# Altium schematic symbol library IC_Maxim.SchLib: 843 symbols (part 5 of 20) (continued)
## MAX5064BATC+
designator U?
125V/2A, High-Speed, Half-Bridge MOSFET Driver, inverting & non-inverting high driver, inverting & non-inverting low driver, 12-Pin TQFN, -40癈 to +125癈, Pb-Free; DatasheetVersion: Rev 5, May-2007; PackageVersion: revJ, 2011; PackageReference: T1244+4; PackageDescription: 12-Pin Thin Quad Flatpack, No Leads, 4 x 4 x 0.75 mm Body, 0.8 mm Pitch, TQFN, Pb-Free; Code_JEDEC: MO-220WGGB; ComponentLink1Description: Manufacturer URL; ComponentLink1URL: http://www.maxim-ic.com; ComponentLink2Description: Datasheet; ComponentLink2URL: http://datasheets.maxim-ic.com/en/ds/MAX5062-MAX5064B.pdf; ComponentLink3Description: Package Specification; ComponentLink3URL: http://pdfserv.maxim-ic.com/package_dwgs/21-0139.PDF
footprint QFN12_0.8-PAD(4X4) (Footprint not found)
pins: 1 BST, 2 DH (out), 3 HS, 4 AGND (power), 5 BBM, 6 IN_H- (in), 7 IN_H+ (in), 8 IN_L- (in), 9 IN_L+ (in), 10 PGND (power), 11 DL (out), 12 VDD (power), 13 EP (power)

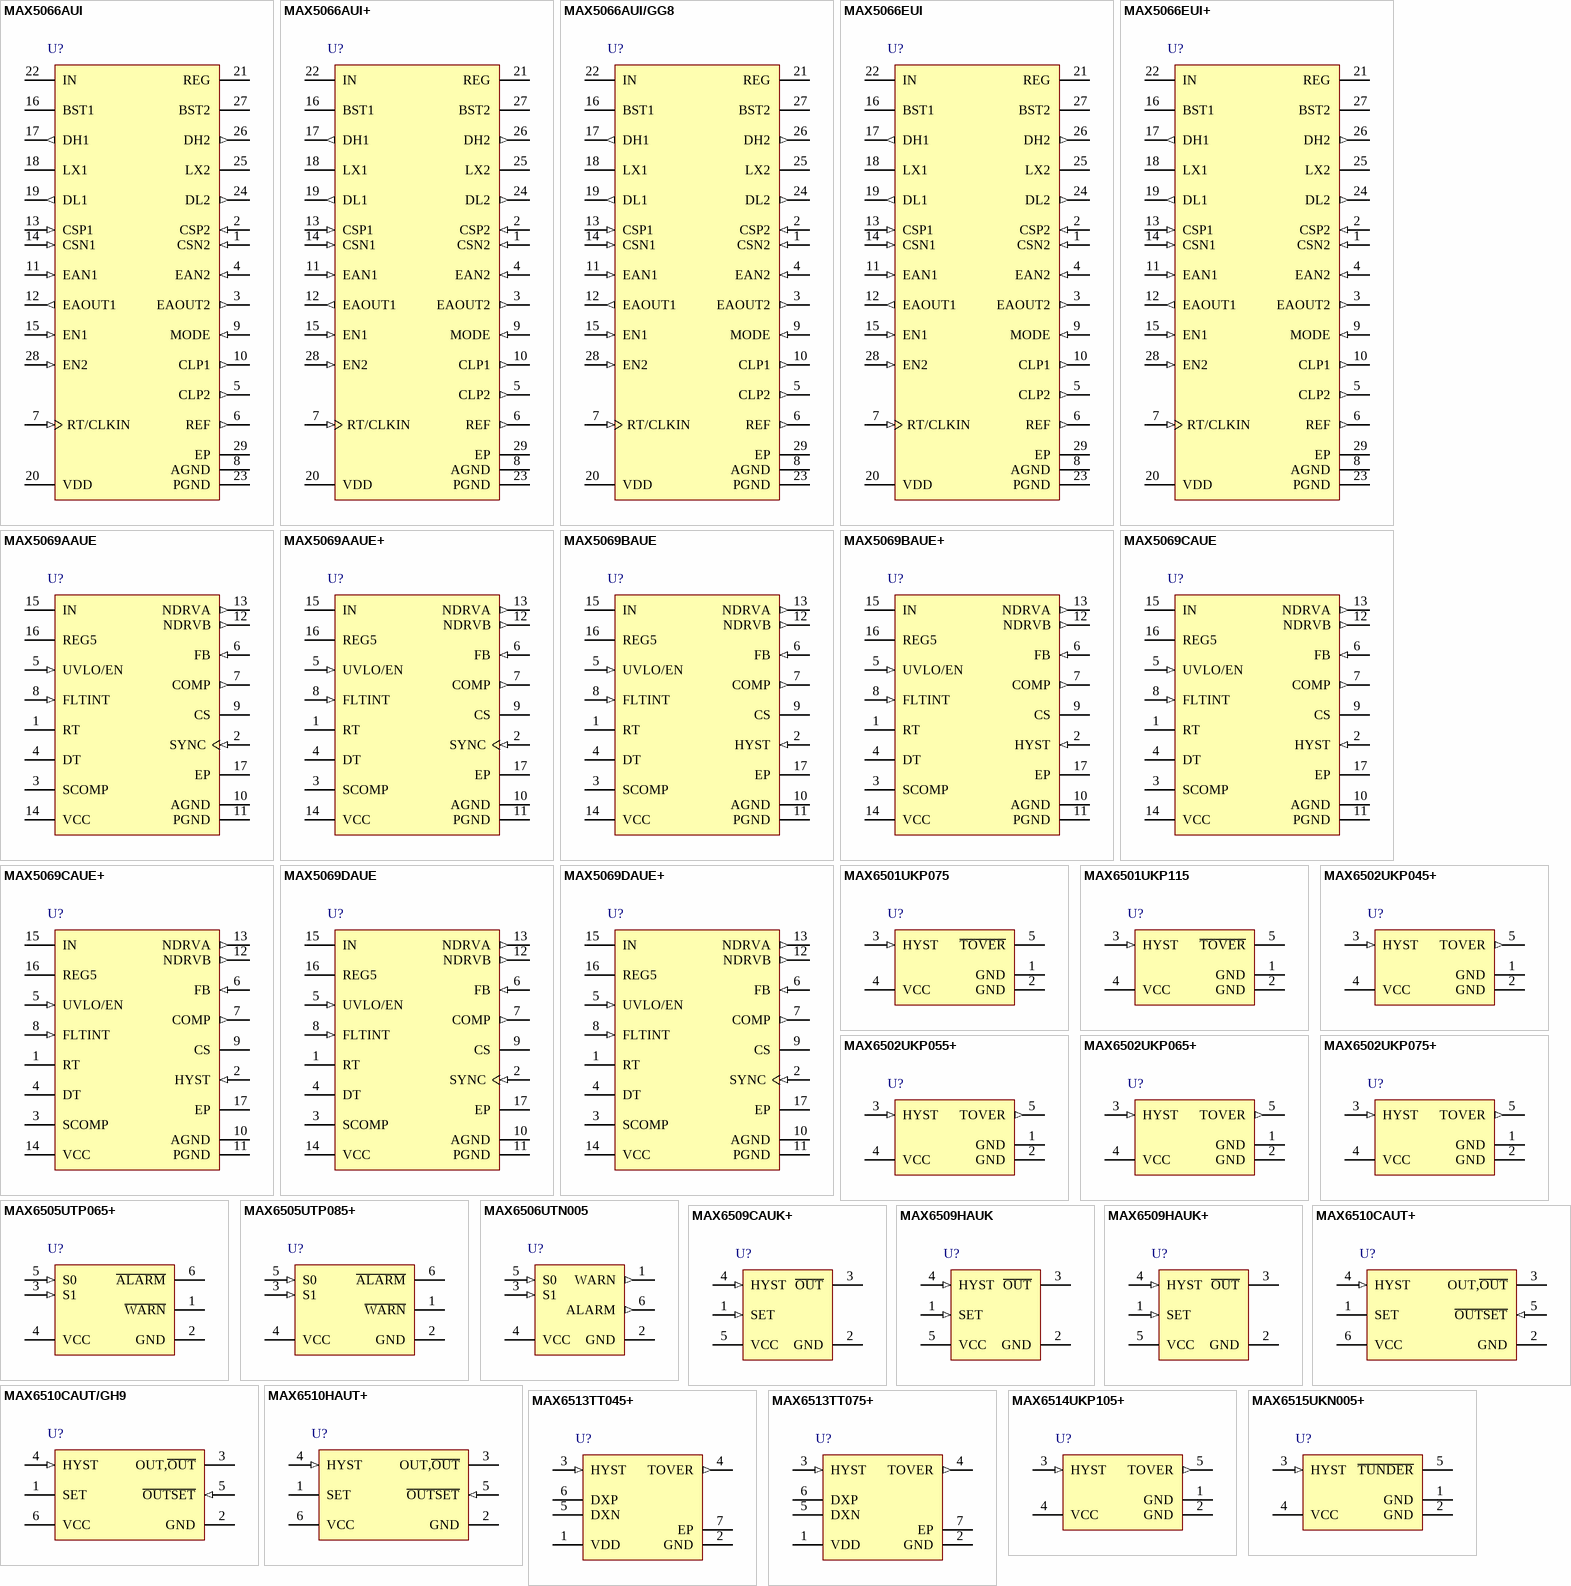
[diagram p8: symbols MAX5066AUI to MAX6515UKN005+]

## MAX5066AUI
designator U?
Configurable, Single-/Dual-Output, Synchronous Buck Controller for High-Current Applications, 28-Pin TSSOP-EP, -40癈 to +125癈; DatasheetVersion: Rev 1, Aug-2005; PackageVersion: revK, 2010; PackageReference: U28E-4; PackageDescription: 28-Pin Thin Shrink Small-Outline Package, Exposed Pad, TSSOP-EP; Code_JEDEC: MO-153-AET; ComponentLink1Description: Manufacturer URL; ComponentLink1URL: http://www.maxim-ic.com; ComponentLink2Description: Datasheet; ComponentLink2URL: http://datasheets.maxim-ic.com/en/ds/MAX5066.pdf; ComponentLink3Description: Package Specification; ComponentLink3URL: http://pdfserv.maxim-ic.com/package_dwgs/21-0108.PDF
footprint TSSOP28_0.65-PAD (Footprint not found)
pins: 1 CSN2 (in), 2 CSP2 (in), 3 EAOUT2 (out), 4 EAN2 (in), 5 CLP2 (out), 6 REF (out), 7 RT/CLKIN (in), 8 AGND (power), 9 MODE (in), 10 CLP1 (out), 11 EAN1 (in), 12 EAOUT1 (out), 13 CSP1 (in), 14 CSN1 (in), 15 EN1 (in), 16 BST1, 17 DH1 (out), 18 LX1, 19 DL1 (out), 20 VDD (power), 21 REG (power), 22 IN (power), 23 PGND (power), 24 DL2 (out), 25 LX2, 26 DH2 (out), 27 BST2, 28 EN2 (in), 29 EP (power)

## MAX5066AUI+
designator U?
Configurable, Single-/Dual-Output, Synchronous Buck Controller for High-Current Applications, 28-Pin TSSOP-EP, -40癈 to +125癈, Pb-Free; DatasheetVersion: Rev 1, Aug-2005; PackageVersion: revK, 2010; PackageReference: U28E+4; PackageDescription: 28-Pin Thin Shrink Small-Outline Package, Exposed Pad, TSSOP-EP, Pb-Free; Code_JEDEC: MO-153-AET; ComponentLink1Description: Manufacturer URL; ComponentLink1URL: http://www.maxim-ic.com; ComponentLink2Description: Datasheet; ComponentLink2URL: http://datasheets.maxim-ic.com/en/ds/MAX5066.pdf; ComponentLink3Description: Package Specification; ComponentLink3URL: http://pdfserv.maxim-ic.com/package_dwgs/21-0108.PDF
footprint TSSOP28_0.65-PAD (Footprint not found)
pins: 1 CSN2 (in), 2 CSP2 (in), 3 EAOUT2 (out), 4 EAN2 (in), 5 CLP2 (out), 6 REF (out), 7 RT/CLKIN (in), 8 AGND (power), 9 MODE (in), 10 CLP1 (out), 11 EAN1 (in), 12 EAOUT1 (out), 13 CSP1 (in), 14 CSN1 (in), 15 EN1 (in), 16 BST1, 17 DH1 (out), 18 LX1, 19 DL1 (out), 20 VDD (power), 21 REG (power), 22 IN (power), 23 PGND (power), 24 DL2 (out), 25 LX2, 26 DH2 (out), 27 BST2, 28 EN2 (in), 29 EP (power)

## MAX5066AUI/GG8
designator U?
Configurable, Single-/Dual-Output, Synchronous Buck Controller for High-Current Applications, 28-Pin TSSOP-EP, -40癈 to +125癈; DatasheetVersion: Rev 1, Aug-2005; PackageVersion: revK, 2010; PackageReference: U28E-4; PackageDescription: 28-Pin Thin Shrink Small-Outline Package, Exposed Pad, TSSOP-EP; Code_JEDEC: MO-153-AET; ComponentLink1Description: Manufacturer URL; ComponentLink1URL: http://www.maxim-ic.com; ComponentLink2Description: Datasheet; ComponentLink2URL: http://datasheets.maxim-ic.com/en/ds/MAX5066.pdf; ComponentLink3Description: Package Specification; ComponentLink3URL: http://pdfserv.maxim-ic.com/package_dwgs/21-0108.PDF
footprint TSSOP28_0.65-PAD (Footprint not found)
pins: 1 CSN2 (in), 2 CSP2 (in), 3 EAOUT2 (out), 4 EAN2 (in), 5 CLP2 (out), 6 REF (out), 7 RT/CLKIN (in), 8 AGND (power), 9 MODE (in), 10 CLP1 (out), 11 EAN1 (in), 12 EAOUT1 (out), 13 CSP1 (in), 14 CSN1 (in), 15 EN1 (in), 16 BST1, 17 DH1 (out), 18 LX1, 19 DL1 (out), 20 VDD (power), 21 REG (power), 22 IN (power), 23 PGND (power), 24 DL2 (out), 25 LX2, 26 DH2 (out), 27 BST2, 28 EN2 (in), 29 EP (power)

## MAX5066EUI
designator U?
Configurable, Single-/Dual-Output, Synchronous Buck Controller for High-Current Applications, 28-Pin TSSOP-EP, -40癈 to +85癈; DatasheetVersion: Rev 1, Aug-2005; PackageVersion: revK, 2010; PackageReference: U28E-4; PackageDescription: 28-Pin Thin Shrink Small-Outline Package, Exposed Pad, TSSOP-EP; Code_JEDEC: MO-153-AET; ComponentLink1Description: Manufacturer URL; ComponentLink1URL: http://www.maxim-ic.com; ComponentLink2Description: Datasheet; ComponentLink2URL: http://datasheets.maxim-ic.com/en/ds/MAX5066.pdf; ComponentLink3Description: Package Specification; ComponentLink3URL: http://pdfserv.maxim-ic.com/package_dwgs/21-0108.PDF
footprint TSSOP28_0.65-PAD (Footprint not found)
pins: 1 CSN2 (in), 2 CSP2 (in), 3 EAOUT2 (out), 4 EAN2 (in), 5 CLP2 (out), 6 REF (out), 7 RT/CLKIN (in), 8 AGND (power), 9 MODE (in), 10 CLP1 (out), 11 EAN1 (in), 12 EAOUT1 (out), 13 CSP1 (in), 14 CSN1 (in), 15 EN1 (in), 16 BST1, 17 DH1 (out), 18 LX1, 19 DL1 (out), 20 VDD (power), 21 REG (power), 22 IN (power), 23 PGND (power), 24 DL2 (out), 25 LX2, 26 DH2 (out), 27 BST2, 28 EN2 (in), 29 EP (power)

## MAX5066EUI+
designator U?
Configurable, Single-/Dual-Output, Synchronous Buck Controller for High-Current Applications, 28-Pin TSSOP-EP, -40癈 to +85癈, Pb-Free; DatasheetVersion: Rev 1, Aug-2005; PackageVersion: revK, 2010; PackageReference: U28E+4; PackageDescription: 28-Pin Thin Shrink Small-Outline Package, Exposed Pad, TSSOP-EP, Pb-Free; Code_JEDEC: MO-153-AET; ComponentLink1Description: Manufacturer URL; ComponentLink1URL: http://www.maxim-ic.com; ComponentLink2Description: Datasheet; ComponentLink2URL: http://datasheets.maxim-ic.com/en/ds/MAX5066.pdf; ComponentLink3Description: Package Specification; ComponentLink3URL: http://pdfserv.maxim-ic.com/package_dwgs/21-0108.PDF
footprint TSSOP28_0.65-PAD (Footprint not found)
pins: 1 CSN2 (in), 2 CSP2 (in), 3 EAOUT2 (out), 4 EAN2 (in), 5 CLP2 (out), 6 REF (out), 7 RT/CLKIN (in), 8 AGND (power), 9 MODE (in), 10 CLP1 (out), 11 EAN1 (in), 12 EAOUT1 (out), 13 CSP1 (in), 14 CSN1 (in), 15 EN1 (in), 16 BST1, 17 DH1 (out), 18 LX1, 19 DL1 (out), 20 VDD (power), 21 REG (power), 22 IN (power), 23 PGND (power), 24 DL2 (out), 25 LX2, 26 DH2 (out), 27 BST2, 28 EN2 (in), 29 EP (power)

## MAX5069AAUE
designator U?
High-Frequency, Current-Mode PWM Controller with Accurate Oscillator and Dual FET Drivers, sync input, 16-Pin TSSOP-EP, -40癈 to +125癈; DatasheetVersion: Rev 1, Jul-2004; PackageVersion: revK, 2010; PackageReference: U16E-3; PackageDescription: 16-Pin Thin Shrink Small Outline Package, Exposed Pad 5 x 4.4 mm Body ,0.65 mm Pitch, TSSOP-EP; Code_JEDEC: MO-153-ABT; ComponentLink1Description: Manufacturer URL; ComponentLink1URL: http://www.maxim-ic.com; ComponentLink2Description: Datasheet; ComponentLink2URL: http://datasheets.maxim-ic.com/en/ds/MAX5069.pdf; ComponentLink3Description: Package Specification; ComponentLink3URL: http://pdfserv.maxim-ic.com/package_dwgs/21-0108.PDF
footprint TSSOP16_0.65-PAD (Footprint not found)
pins: 1 RT, 2 SYNC (in), 3 SCOMP, 4 DT, 5 UVLO/EN (in), 6 FB (in), 7 COMP (out), 8 FLTINT (in), 9 CS, 10 AGND (power), 11 PGND (power), 12 NDRVB (out), 13 NDRVA (out), 14 VCC (power), 15 IN (power), 16 REG5 (power), 17 EP (power)

## MAX5069AAUE+
designator U?
High-Frequency, Current-Mode PWM Controller with Accurate Oscillator and Dual FET Drivers, sync input, 16-Pin TSSOP-EP, -40癈 to +125癈, Pb-Free; DatasheetVersion: Rev 1, Jul-2004; PackageVersion: revK, 2010; PackageReference: U16E+3; PackageDescription: 16-Pin Thin Shrink Small Outline Package, Exposed Pad 5 x 4.4 mm Body ,0.65 mm Pitch, TSSOP-EP, Pb-Free; Code_JEDEC: MO-153-ABT; ComponentLink1Description: Manufacturer URL; ComponentLink1URL: http://www.maxim-ic.com; ComponentLink2Description: Datasheet; ComponentLink2URL: http://datasheets.maxim-ic.com/en/ds/MAX5069.pdf; ComponentLink3Description: Package Specification; ComponentLink3URL: http://pdfserv.maxim-ic.com/package_dwgs/21-0108.PDF
footprint TSSOP16_0.65-PAD (Footprint not found)
pins: 1 RT, 2 SYNC (in), 3 SCOMP, 4 DT, 5 UVLO/EN (in), 6 FB (in), 7 COMP (out), 8 FLTINT (in), 9 CS, 10 AGND (power), 11 PGND (power), 12 NDRVB (out), 13 NDRVA (out), 14 VCC (power), 15 IN (power), 16 REG5 (power), 17 EP (power)

## MAX5069BAUE
designator U?
High-Frequency, Current-Mode PWM Controller with Accurate Oscillator and Dual FET Drivers, 16-Pin TSSOP-EP, -40癈 to +125癈; DatasheetVersion: Rev 1, Jul-2004; PackageVersion: revK, 2010; PackageReference: U16E-3; PackageDescription: 16-Pin Thin Shrink Small Outline Package, Exposed Pad 5 x 4.4 mm Body ,0.65 mm Pitch, TSSOP-EP; Code_JEDEC: MO-153-ABT; ComponentLink1Description: Manufacturer URL; ComponentLink1URL: http://www.maxim-ic.com; ComponentLink2Description: Datasheet; ComponentLink2URL: http://datasheets.maxim-ic.com/en/ds/MAX5069.pdf; ComponentLink3Description: Package Specification; ComponentLink3URL: http://pdfserv.maxim-ic.com/package_dwgs/21-0108.PDF
footprint TSSOP16_0.65-PAD (Footprint not found)
pins: 1 RT, 2 HYST (in), 3 SCOMP, 4 DT, 5 UVLO/EN (in), 6 FB (in), 7 COMP (out), 8 FLTINT (in), 9 CS, 10 AGND (power), 11 PGND (power), 12 NDRVB (out), 13 NDRVA (out), 14 VCC (power), 15 IN (power), 16 REG5 (power), 17 EP (power)

## MAX5069BAUE+
designator U?
High-Frequency, Current-Mode PWM Controller with Accurate Oscillator and Dual FET Drivers, 16-Pin TSSOP-EP, -40癈 to +125癈, Pb-Free; DatasheetVersion: Rev 1, Jul-2004; PackageVersion: revK, 2010; PackageReference: U16E+3; PackageDescription: 16-Pin Thin Shrink Small Outline Package, Exposed Pad 5 x 4.4 mm Body ,0.65 mm Pitch, TSSOP-EP, Pb-Free; Code_JEDEC: MO-153-ABT; ComponentLink1Description: Manufacturer URL; ComponentLink1URL: http://www.maxim-ic.com; ComponentLink2Description: Datasheet; ComponentLink2URL: http://datasheets.maxim-ic.com/en/ds/MAX5069.pdf; ComponentLink3Description: Package Specification; ComponentLink3URL: http://pdfserv.maxim-ic.com/package_dwgs/21-0108.PDF
footprint TSSOP16_0.65-PAD (Footprint not found)
pins: 1 RT, 2 HYST (in), 3 SCOMP, 4 DT, 5 UVLO/EN (in), 6 FB (in), 7 COMP (out), 8 FLTINT (in), 9 CS, 10 AGND (power), 11 PGND (power), 12 NDRVB (out), 13 NDRVA (out), 14 VCC (power), 15 IN (power), 16 REG5 (power), 17 EP (power)

## MAX5069CAUE
designator U?
High-Frequency, Current-Mode PWM Controller with Accurate Oscillator and Dual FET Drivers, 16-Pin TSSOP-EP, -40癈 to +125癈; DatasheetVersion: Rev 1, Jul-2004; PackageVersion: revK, 2010; PackageReference: U16E-3; PackageDescription: 16-Pin Thin Shrink Small Outline Package, Exposed Pad 5 x 4.4 mm Body ,0.65 mm Pitch, TSSOP-EP; Code_JEDEC: MO-153-ABT; ComponentLink1Description: Manufacturer URL; ComponentLink1URL: http://www.maxim-ic.com; ComponentLink2Description: Datasheet; ComponentLink2URL: http://datasheets.maxim-ic.com/en/ds/MAX5069.pdf; ComponentLink3Description: Package Specification; ComponentLink3URL: http://pdfserv.maxim-ic.com/package_dwgs/21-0108.PDF
footprint TSSOP16_0.65-PAD (Footprint not found)
pins: 1 RT, 2 HYST (in), 3 SCOMP, 4 DT, 5 UVLO/EN (in), 6 FB (in), 7 COMP (out), 8 FLTINT (in), 9 CS, 10 AGND (power), 11 PGND (power), 12 NDRVB (out), 13 NDRVA (out), 14 VCC (power), 15 IN (power), 16 REG5 (power), 17 EP (power)

## MAX5069CAUE+
designator U?
High-Frequency, Current-Mode PWM Controller with Accurate Oscillator and Dual FET Drivers, 16-Pin TSSOP-EP, -40癈 to +125癈, Pb-Free; DatasheetVersion: Rev 1, Jul-2004; PackageVersion: revK, 2010; PackageReference: U16E+3; PackageDescription: 16-Pin Thin Shrink Small Outline Package, Exposed Pad 5 x 4.4 mm Body ,0.65 mm Pitch, TSSOP-EP, Pb-Free; Code_JEDEC: MO-153-ABT; ComponentLink1Description: Manufacturer URL; ComponentLink1URL: http://www.maxim-ic.com; ComponentLink2Description: Datasheet; ComponentLink2URL: http://datasheets.maxim-ic.com/en/ds/MAX5069.pdf; ComponentLink3Description: Package Specification; ComponentLink3URL: http://pdfserv.maxim-ic.com/package_dwgs/21-0108.PDF
footprint TSSOP16_0.65-PAD (Footprint not found)
pins: 1 RT, 2 HYST (in), 3 SCOMP, 4 DT, 5 UVLO/EN (in), 6 FB (in), 7 COMP (out), 8 FLTINT (in), 9 CS, 10 AGND (power), 11 PGND (power), 12 NDRVB (out), 13 NDRVA (out), 14 VCC (power), 15 IN (power), 16 REG5 (power), 17 EP (power)

## MAX5069DAUE
designator U?
High-Frequency, Current-Mode PWM Controller with Accurate Oscillator and Dual FET Drivers, sync input, 16-Pin TSSOP-EP, -40癈 to +125癈; DatasheetVersion: Rev 1, Jul-2004; PackageVersion: revK, 2010; PackageReference: U16E-3; PackageDescription: 16-Pin Thin Shrink Small Outline Package, Exposed Pad 5 x 4.4 mm Body ,0.65 mm Pitch, TSSOP-EP; Code_JEDEC: MO-153-ABT; ComponentLink1Description: Manufacturer URL; ComponentLink1URL: http://www.maxim-ic.com; ComponentLink2Description: Datasheet; ComponentLink2URL: http://datasheets.maxim-ic.com/en/ds/MAX5069.pdf; ComponentLink3Description: Package Specification; ComponentLink3URL: http://pdfserv.maxim-ic.com/package_dwgs/21-0108.PDF
footprint TSSOP16_0.65-PAD (Footprint not found)
pins: 1 RT, 2 SYNC (in), 3 SCOMP, 4 DT, 5 UVLO/EN (in), 6 FB (in), 7 COMP (out), 8 FLTINT (in), 9 CS, 10 AGND (power), 11 PGND (power), 12 NDRVB (out), 13 NDRVA (out), 14 VCC (power), 15 IN (power), 16 REG5 (power), 17 EP (power)

## MAX5069DAUE+
designator U?
High-Frequency, Current-Mode PWM Controller with Accurate Oscillator and Dual FET Drivers, sync input, 16-Pin TSSOP-EP, -40癈 to +125癈, Pb-Free; DatasheetVersion: Rev 1, Jul-2004; PackageVersion: revK, 2010; PackageReference: U16E+3; PackageDescription: 16-Pin Thin Shrink Small Outline Package, Exposed Pad 5 x 4.4 mm Body ,0.65 mm Pitch, TSSOP-EP, Pb-Free; Code_JEDEC: MO-153-ABT; ComponentLink1Description: Manufacturer URL; ComponentLink1URL: http://www.maxim-ic.com; ComponentLink2Description: Datasheet; ComponentLink2URL: http://datasheets.maxim-ic.com/en/ds/MAX5069.pdf; ComponentLink3Description: Package Specification; ComponentLink3URL: http://pdfserv.maxim-ic.com/package_dwgs/21-0108.PDF
footprint TSSOP16_0.65-PAD (Footprint not found)
pins: 1 RT, 2 SYNC (in), 3 SCOMP, 4 DT, 5 UVLO/EN (in), 6 FB (in), 7 COMP (out), 8 FLTINT (in), 9 CS, 10 AGND (power), 11 PGND (power), 12 NDRVB (out), 13 NDRVA (out), 14 VCC (power), 15 IN (power), 16 REG5 (power), 17 EP (power)

## MAX6501UKP075
designator U?
Low-Cost, 2.7 to 5.5 V, Micropower Open-Drain Temperature Switch with Hot Trip Threshold, -55 to 125 degC, 5-Pin SOT23 (U5-2); Generic Part Number: MAX6501; PartNumber: MAX6501UKP075; Functions: Temperature Switch/Temperature Comparator; Interface: Logic; DatasheetVersion: Rev. 6; PackageVersion: Rev. G, 04/2011; PackageReference: U5-2; PackageDescription: 5-Pin Small-Outline Transistor Package, Body 1.625 x 2.9 mm, Pitch 0.95 mm; Supplier Part Number 1: N/A; Mounting Technology: Surface Mount; Code_JEDEC: MO-178; ComponentLink1Description: Manufacturer URL; ComponentLink1URL: http://www.maximintegrated.com/; ComponentLink2Description: Datasheet; ComponentLink2URL: http://datasheets.maximintegrated.com/en/ds/MAX6501; ComponentLink3Description: Package Specification; ComponentLink3URL: http://pdfserv.maximintegrated.com/package_dwgs/21-0057.PDF
footprint SOT23-5 (Footprint not found)
pins: 1 GND (power) "Ground. Not internally connected. Connect both ground pins together close to the chip. Pin 2 provides the lowest thermal resistance to the die.", 2 GND (power) "Ground. Not internally connected. Connect both ground pins together close to the chip. Pin 2 provides the lowest thermal resistance to the die.", 3 HYST (in) "Hysteresis Input. Connect HYST to GND for 2degreesC hysteresis, or connect to VCC for 10 degreesC hysteresis.", 4 VCC (power) "Supply Input (+2.7V to +5.5V)", 5 ~{TOVER} (oc) "Open-Drain, Active-Low Output. T\O\V\E\R\ goes low when the die temperature exceeds the factory-programmed temperature threshold. Connect to a 100k ohm pullup resistor. May be pulled up to a voltage higher than VCC."

## MAX6501UKP115
designator U?
Low-Cost, 2.7 to 5.5 V, Micropower Open-Drain Temperature Switch with Hot Trip Threshold, -55 to 125 degC, 5-Pin SOT23 (U5-2); Generic Part Number: MAX6501; PartNumber: MAX6501UKP115; Functions: Temperature Switch/Temperature Comparator; Interface: Logic; DatasheetVersion: Rev. 6; PackageVersion: Rev. G, 04/2011; PackageReference: U5-2; PackageDescription: 5-Pin Small-Outline Transistor Package, Body 1.625 x 2.9 mm, Pitch 0.95 mm; Supplier Part Number 1: N/A; Mounting Technology: Surface Mount; Code_JEDEC: MO-178; ComponentLink1Description: Manufacturer URL; ComponentLink1URL: http://www.maximintegrated.com/; ComponentLink2Description: Datasheet; ComponentLink2URL: http://datasheets.maximintegrated.com/en/ds/MAX6501; ComponentLink3Description: Package Specification; ComponentLink3URL: http://pdfserv.maximintegrated.com/package_dwgs/21-0057.PDF
footprint SOT23-5 (Footprint not found)
pins: 1 GND (power) "Ground. Not internally connected. Connect both ground pins together close to the chip. Pin 2 provides the lowest thermal resistance to the die.", 2 GND (power) "Ground. Not internally connected. Connect both ground pins together close to the chip. Pin 2 provides the lowest thermal resistance to the die.", 3 HYST (in) "Hysteresis Input. Connect HYST to GND for 2degreesC hysteresis, or connect to VCC for 10 degreesC hysteresis.", 4 VCC (power) "Supply Input (+2.7V to +5.5V)", 5 ~{TOVER} (oc) "Open-Drain, Active-Low Output. T\O\V\E\R\ goes low when the die temperature exceeds the factory-programmed temperature threshold. Connect to a 100k ohm pullup resistor. May be pulled up to a voltage higher than VCC."

## MAX6502UKP045+
designator U?
Low-Cost, 2.7 to 5.5 V, Micropower, Push / Pull Temperature Switch with Hot Trip Threshold, -55 to 125 degC, 5-Pin SOT23 (U5+2), Pb-Free; Generic Part Number: MAX6502; PartNumber: MAX6502UKP045+; Functions: Temperature Switch/Temperature Comparator; Interface: Logic; DatasheetVersion: Rev. 6; PackageVersion: Rev. G, 04/2011; PackageReference: U5+2; PackageDescription: 5-Pin Small-Outline Transistor Package, Body 1.625 x 2.9 mm, Pitch 0.95 mm; Supplier Part Number 1: N/A; Mounting Technology: Surface Mount; Code_JEDEC: MO178; ComponentLink1Description: Manufacturer URL; ComponentLink1URL: http://www.maximintegrated.com/; ComponentLink2Description: Datasheet; ComponentLink2URL: http://datasheets.maximintegrated.com/en/ds/MAX6502; ComponentLink3Description: Package Specification; ComponentLink3URL: http://pdfserv.maximintegrated.com/package_dwgs/21-0057.PDF
footprint SOT23-5 (Footprint not found)
pins: 1 GND (power) "Ground", 2 GND (power) "Ground", 3 HYST (in) "Hysteresis Input. Connect to VCC for 2degreesC of hysteresis or to GND for 10degreesC hysteresis.", 4 VCC (power) "Input Supply. Bypass to ground with a 0.1uF capacitor.", 5 TOVER (out) "Push-Pull Active-High Output (Hot Threshold). TOVER goes high when the die temperature exceeds the factory-programmed hot-temperature threshold."

## MAX6502UKP055+
designator U?
Low-Cost, 2.7 to 5.5 V, Micropower, Push / Pull Temperature Switch with Hot Trip Threshold, -55 to 125 degC, 5-Pin SOT23 (U5+2), Pb-Free; Generic Part Number: MAX6502; PartNumber: MAX6502UKP055+; Functions: Temperature Switch/Temperature Comparator; Interface: Logic; DatasheetVersion: Rev. 6; PackageVersion: Rev. G, 04/2011; PackageReference: U5+2; PackageDescription: 5-Pin Small-Outline Transistor Package, Body 1.625 x 2.9 mm, Pitch 0.95 mm; Supplier Part Number 1: N/A; Mounting Technology: Surface Mount; Code_JEDEC: MO178; ComponentLink1Description: Manufacturer URL; ComponentLink1URL: http://www.maximintegrated.com/; ComponentLink2Description: Datasheet; ComponentLink2URL: http://datasheets.maximintegrated.com/en/ds/MAX6502; ComponentLink3Description: Package Specification; ComponentLink3URL: http://pdfserv.maximintegrated.com/package_dwgs/21-0057.PDF
footprint SOT23-5 (Footprint not found)
pins: 1 GND (power) "Ground", 2 GND (power) "Ground", 3 HYST (in) "Hysteresis Input. Connect to VCC for 2degreesC of hysteresis or to GND for 10degreesC hysteresis.", 4 VCC (power) "Input Supply. Bypass to ground with a 0.1uF capacitor.", 5 TOVER (out) "Push-Pull Active-High Output (Hot Threshold). TOVER goes high when the die temperature exceeds the factory-programmed hot-temperature threshold."

## MAX6502UKP065+
designator U?
Low-Cost, 2.7 to 5.5 V, Micropower, Push / Pull Temperature Switch with Hot Trip Threshold, -55 to 125 degC, 5-Pin SOT23 (U5+2), Pb-Free; Generic Part Number: MAX6502; PartNumber: MAX6502UKP065+; Functions: Temperature Switch/Temperature Comparator; Interface: Logic; DatasheetVersion: Rev. 6; PackageVersion: Rev. G, 04/2011; PackageReference: U5+2; PackageDescription: 5-Pin Small-Outline Transistor Package, Body 1.625 x 2.9 mm, Pitch 0.95 mm; Supplier Part Number 1: N/A; Mounting Technology: Surface Mount; Code_JEDEC: MO178; ComponentLink1Description: Manufacturer URL; ComponentLink1URL: http://www.maximintegrated.com/; ComponentLink2Description: Datasheet; ComponentLink2URL: http://datasheets.maximintegrated.com/en/ds/MAX6502; ComponentLink3Description: Package Specification; ComponentLink3URL: http://pdfserv.maximintegrated.com/package_dwgs/21-0057.PDF
footprint SOT23-5 (Footprint not found)
pins: 1 GND (power) "Ground", 2 GND (power) "Ground", 3 HYST (in) "Hysteresis Input. Connect to VCC for 2degreesC of hysteresis or to GND for 10degreesC hysteresis.", 4 VCC (power) "Input Supply. Bypass to ground with a 0.1uF capacitor.", 5 TOVER (out) "Push-Pull Active-High Output (Hot Threshold). TOVER goes high when the die temperature exceeds the factory-programmed hot-temperature threshold."

## MAX6502UKP075+
designator U?
Low-Cost, 2.7 to 5.5 V, Micropower, Push / Pull Temperature Switch with Hot Trip Threshold, -55 to 125 degC, 5-Pin SOT23 (U5+2), Pb-Free; Generic Part Number: MAX6502; PartNumber: MAX6502UKP075+; Functions: Temperature Switch/Temperature Comparator; Interface: Logic; DatasheetVersion: Rev. 6; PackageVersion: Rev. G, 04/2011; PackageReference: U5+2; PackageDescription: 5-Pin Small-Outline Transistor Package, Body 1.625 x 2.9 mm, Pitch 0.95 mm; Supplier Part Number 1: N/A; Mounting Technology: Surface Mount; Code_JEDEC: MO178; ComponentLink1Description: Manufacturer URL; ComponentLink1URL: http://www.maximintegrated.com/; ComponentLink2Description: Datasheet; ComponentLink2URL: http://datasheets.maximintegrated.com/en/ds/MAX6502; ComponentLink3Description: Package Specification; ComponentLink3URL: http://pdfserv.maximintegrated.com/package_dwgs/21-0057.PDF
footprint SOT23-5 (Footprint not found)
pins: 1 GND (power) "Ground", 2 GND (power) "Ground", 3 HYST (in) "Hysteresis Input. Connect to VCC for 2degreesC of hysteresis or to GND for 10degreesC hysteresis.", 4 VCC (power) "Input Supply. Bypass to ground with a 0.1uF capacitor.", 5 TOVER (out) "Push-Pull Active-High Output (Hot Threshold). TOVER goes high when the die temperature exceeds the factory-programmed hot-temperature threshold."

## MAX6505UTP065+
designator U?
Dual Trip Temperature Switch, -40 to 125 degC, 6-Pin SOT23 (U6SN+1), Pb-Free; Generic Part Number: MAX6505; PartNumber: MAX6505UTP065+; Functions: Temperature Switch/Temperature Comparator; Interface: Logic; DatasheetVersion: Rev. 1; PackageVersion: Rev. N, 08/2012; PackageReference: U6SN+1; PackageDescription: 6-Pin Small-Outline Transistor Package, Body 1.625 x 2.9 mm, Pitch 0.95 mm; Supplier Part Number 1: N/A; Mounting Technology: Surface Mount; Code_JEDEC: MO-178; ComponentLink1Description: Manufacturer URL; ComponentLink1URL: http://www.maximintegrated.com/; ComponentLink2Description: Datasheet; ComponentLink2URL: http://datasheets.maximintegrated.com/en/ds/MAX6505; ComponentLink3Description: Package Specification; ComponentLink3URL: http://pdfserv.maximintegrated.com/package_dwgs/21-0058.PDF
footprint SOT23-6 (Footprint not found)
pins: 1 ~{WARN} (oc) "Open-Drain Active-Low Warning Output. W\A\R\N\ goes low when the die temperature exceeds TWARN = TALARM - deltaTAW.", 2 GND (power) "Ground", 3 S1 (in) "Delta Temperature Select Input. Connect to VCC or GND to select the difference between TALARM and TWARN (Table 1 or see Electrical Characteristics).", 4 VCC (power) "Supply Voltage Input. Bypass VCC to GND with a 0.1uF ceramic capacitor.", 5 S0 (in) "Delta Temperature Select Input. Connect to VCC or GND to select the difference between TALARM and TWARN (Table 1 or see Electrical Characteristics).", 6 ~{ALARM} (oc) "Open-Drain Active-Low Alarm Output. A\L\A\R\M\ goes low when the die temperature exceeds the factory-set value of TALARM."

## MAX6505UTP085+
designator U?
Dual Trip Temperature Switch, -40 to 125 degC, 6-Pin SOT23 (U6SN+1), Pb-Free; Generic Part Number: MAX6505; PartNumber: MAX6505UTP085+; Functions: Temperature Switch/Temperature Comparator; Interface: Logic; DatasheetVersion: Rev. 1; PackageVersion: Rev. N, 08/2012; PackageReference: U6SN+1; PackageDescription: 6-Pin Small-Outline Transistor Package, Body 1.625 x 2.9 mm, Pitch 0.95 mm; Supplier Part Number 1: N/A; Mounting Technology: Surface Mount; Code_JEDEC: MO-178; ComponentLink1Description: Manufacturer URL; ComponentLink1URL: http://www.maximintegrated.com/; ComponentLink2Description: Datasheet; ComponentLink2URL: http://datasheets.maximintegrated.com/en/ds/MAX6505; ComponentLink3Description: Package Specification; ComponentLink3URL: http://pdfserv.maximintegrated.com/package_dwgs/21-0058.PDF
footprint SOT23-6 (Footprint not found)
pins: 1 ~{WARN} (oc) "Open-Drain Active-Low Warning Output. W\A\R\N\ goes low when the die temperature exceeds TWARN = TALARM - deltaTAW.", 2 GND (power) "Ground", 3 S1 (in) "Delta Temperature Select Input. Connect to VCC or GND to select the difference between TALARM and TWARN (Table 1 or see Electrical Characteristics).", 4 VCC (power) "Supply Voltage Input. Bypass VCC to GND with a 0.1uF ceramic capacitor.", 5 S0 (in) "Delta Temperature Select Input. Connect to VCC or GND to select the difference between TALARM and TWARN (Table 1 or see Electrical Characteristics).", 6 ~{ALARM} (oc) "Open-Drain Active-Low Alarm Output. A\L\A\R\M\ goes low when the die temperature exceeds the factory-set value of TALARM."

## MAX6506UTN005
designator U?
Dual Trip Temperature Switch, -40 to 125 degC, 6-Pin SOT23 (U6SN+1), Pb-Free, Tape and Reel; Generic Part Number: MAX6506; PartNumber: MAX6506UTN005+T; Functions: Temperature Switch/Temperature Comparator; Interface: Logic; DatasheetVersion: Rev. 1; PackageVersion: Rev. N, 08/2012; PackageReference: U6SN+1; PackageDescription: 6-Pin Small-Outline Transistor Package, Body 1.625 x 2.9 mm, Pitch 0.95 mm; Packing: Tape and Reel; Mounting Technology: Surface Mount; Code_JEDEC: MO-178; ComponentLink1Description: Manufacturer URL; ComponentLink1URL: http://www.maximintegrated.com/; ComponentLink2Description: Datasheet; ComponentLink2URL: http://datasheets.maximintegrated.com/en/ds/MAX6505-MAX6508.pdf; ComponentLink3Description: Package Specification; ComponentLink3URL: http://pdfserv.maximintegrated.com/package_dwgs/21-0058.PDF
footprint SOT23-6 (Footprint not found)
pins: 1 WARN (out) "Push-Pull Active-High Warning Output. WARN goes high when the die temperature exceeds TWARN = TALARM   - delta TAW", 2 GND (power) "Ground", 3 S1 (in) "Delta Temperature Select Input. Connect to VCC or GND to select the difference between TALARM and TWARN (Table 1 or see Electrical Characteristics).", 4 VCC (power) "Supply Voltage Input. Bypass VCC to GND with a 0.1uF ceramic capacitor.", 5 S0 (in) "Delta Temperature Select Input. Connect to VCC or GND to select the difference between TALARM and TWARN (Table 1 or see Electrical Characteristics).", 6 ALARM (out) "Push-Pull Active-High Alarm Output. ALARM goes high when the die temperature exceeds the factory-set value of TALARM"

## MAX6509CAUK+
designator U?
Temperature Switch with Resistor-Programmable Threshold, -40 to 125 degC, 5-Pin SOT23 (U5+1), Pb-Free; Generic Part Number: MAX6509; PartNumber: MAX6509CAUK+; Functions: Temperature Switch/Temperature Comparator; Interface: Logic; DatasheetVersion: Rev. 2; PackageVersion: Rev. G, 04/2011; PackageReference: U5+1; PackageDescription: 5-Pin Small-Outline Transistor Package (U5+1), Body 2.90 x 1.625 mm, Pitch 0.95 mm; Supplier Part Number 1: N/A; Mounting Technology: Surface Mount; Code_JEDEC: MO178; ComponentLink1Description: Manufacturer URL; ComponentLink1URL: http://www.maximintegrated.com/; ComponentLink2Description: Datasheet; ComponentLink2URL: http://datasheets.maximintegrated.com/en/ds/MAX6509; ComponentLink3Description: Package Specification; ComponentLink3URL: http://pdfserv.maximintegrated.com/package_dwgs/21-0057.PDF
footprint SOT23-5 (Footprint not found)
pins: 1 SET (in) "Temperature Set Point. Connect an external 1% resistor from SET to GND to set trip point.", 2 GND (power) "Ground", 3 ~{OUT} (hiz) "Open-Drain Output. Reset to high impedance during power-on.", 4 HYST (in) "Hysteresis Selection. Hysteresis is 10 degreesC for HYST = VCC, 2 degreesC for HYST = GND.", 5 VCC (power) "Power-Supply Input"